# Altium footprint library Selex_PCBLib.PcbLib: 388 footprints (part 17 of 25)
Each footprint in its own frame and in the unit in brackets; x right, y up, seen from the top. Pads: shape width x height; smd on the part's side, far side on the other; paste and mask are expansions set on the pad; w line width, h text height; cw(c..) or ccw(c..) is an arc to the next point about the centre after c.
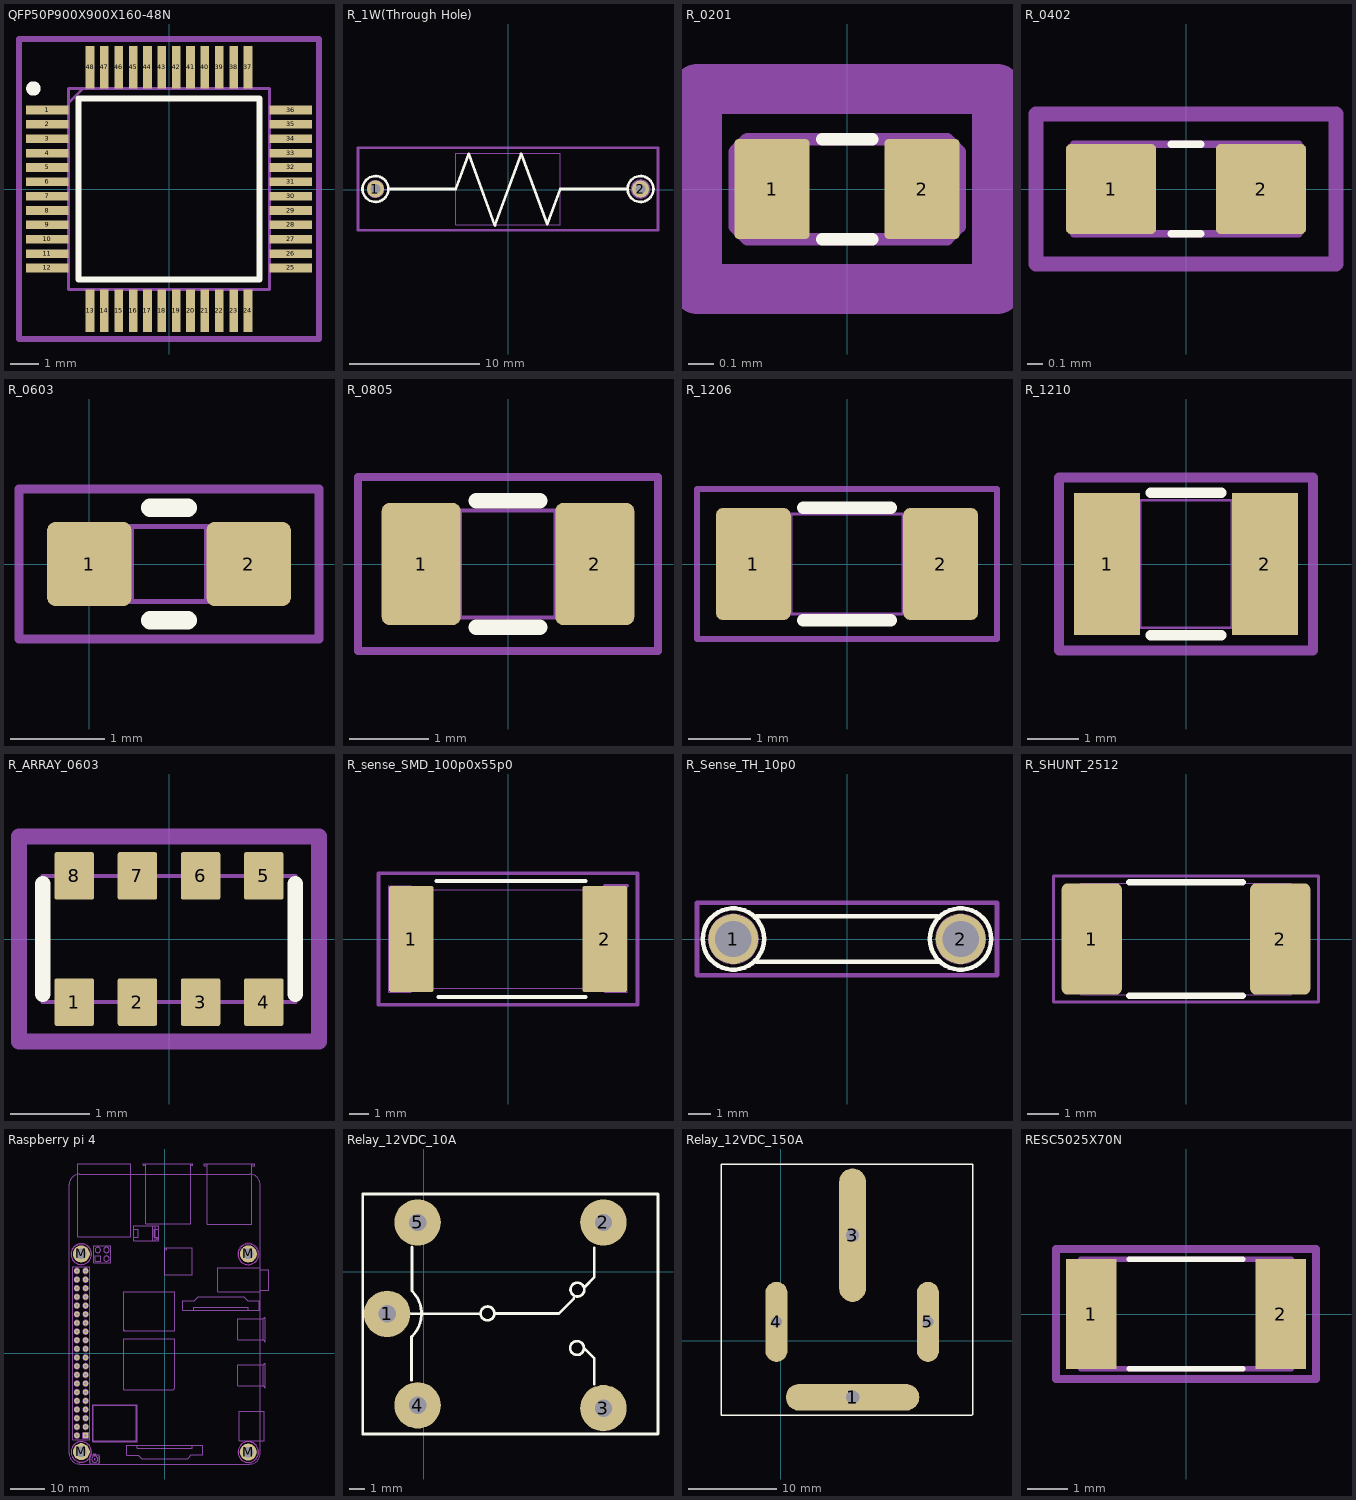
[diagram p16: the footprints below, top view; thin cyan lines are the x and y axes]

## QFP50P900X900X160-48N [mm]
pads (48):
  rect 1.475x0.3 smd: 1(-4.238,2.75) 2(-4.238,2.25) 3(-4.238,1.75) 4(-4.238,1.25) 5(-4.238,0.75) 6(-4.238,0.25) 7(-4.238,-0.25) 8(-4.238,-0.75) 9(-4.238,-1.25) 10(-4.238,-1.75) 11(-4.238,-2.25) 12(-4.238,-2.75) 25(4.238,-2.75) 26(4.238,-2.25) 27(4.238,-1.75) 28(4.238,-1.25) 29(4.238,-0.75) 30(4.238,-0.25) 31(4.238,0.25) 32(4.238,0.75) 33(4.238,1.25) 34(4.238,1.75) 35(4.238,2.25) 36(4.238,2.75)
  rect 0.3x1.475 smd: 13(-2.75,-4.238) 14(-2.25,-4.238) 15(-1.75,-4.238) 16(-1.25,-4.238) 17(-0.75,-4.238) 18(-0.25,-4.238) 19(0.25,-4.238) 20(0.75,-4.238) 21(1.25,-4.238) 22(1.75,-4.238) 23(2.25,-4.238) 24(2.75,-4.238) 37(2.75,4.238) 38(2.25,4.238) 39(1.75,4.238) 40(1.25,4.238) 41(0.75,4.238) 42(0.25,4.238) 43(-0.25,4.238) 44(-0.75,4.238) 45(-1.25,4.238) 46(-1.75,4.238) 47(-2.25,4.238) 48(-2.75,4.238)
Top Overlay:
  circle w0.25: c-4.725,3.5 r0.125
  lines w0.2: -3.15,-3.15 3.15,-3.15 3.15,3.15 -3.15,3.15 -3.15,-3.15
Mechanical 13:
  lines w0.1: -3.5,3 -3,3.5 ; -3.5,-3.5 3.5,-3.5 3.5,3.5 -3.5,3.5 -3.5,-3.5
Mechanical 15:
  lines w0.2: -5.225,-5.225 5.225,-5.225 5.225,5.225 -5.225,5.225 -5.225,-5.225
3D body "stm32f103c8t6.stp": height 1.6, standoff 0, extent -4.5,-4.5 4.5,4.5

## R_1W(Through Hole) [mm]
pads (2):
  round 1.3 hole 0.8 mask+0.1: 1(-10.16,0.05) 2(10.16,0.05)
Top Overlay:
  circle w0.2: c-10.16,0.05 r0.995
  circle w0.2: c10.16,0.05 r0.995
  lines w0.2: -9.165,0.05 -4,0.05 -3,2.75 -1,-2.75 1,2.75 3,-2.65 4,0.05 9.1,0.05
Mechanical 1:
  circle w0.2: c10.16,0.05 r0.65
  circle w0.05: c-10.16,0.05 r0.65
  lines w0.05: -9.51,0.05 -4,0.05 ; 4,0.05 9.5,0.05 ; -4,-2.7 -4,2.8 4,2.8 4,-2.7 -4,-2.7
  text "1W" at -1.3,-0.85 h1.6
Mechanical 15:
  lines w0.1: -11.5,-3.1 -11.5,-3.1
  lines w0.2: -11.5,-3.1 -11.5,3.2 11.5,3.2 11.5,-3.1 -11.5,-3.1
3D body "RES2Wa.step": height 6.25, standoff -9.25, extent -10.56,-2.8 10.56,2.7

## R_0201 [mm] "Resistor 0201"
pads (2):
  rrect10% 0.3x0.4 smd mask+0.01: 1(-0.3,0) 2(0.3,0)
Top Overlay:
  lines w0.05: -0.1,-0.2 0.1,-0.2 ; -0.1,0.2 0.1,0.2
Mechanical 1:
  lines w0.05: -0.3,-0.2 -0.3,0.2 ; 0.3,-0.2 0.3,0.2 ; -0.45,0.15 -0.4,0.2 ; -0.45,0.15 -0.4,0.2 ; -0.45,0.15 -0.45,-0.15 -0.4,-0.2 0,-0.2 0.4,-0.2 0.45,-0.15 0.45,0.15 0.4,0.2 0,0.2 -0.4,0.2
Mechanical 15:
  lines w0.2: -0.6,-0.4 0.6,-0.4 0.6,0.4 -0.6,0.4 -0.6,-0.4
3D body "User Library-RES_0603-0201.step": height 0.34, standoff 0, extent -0.34,-0.165 0.34,0.165

## R_0402 [mm] "Resistor 0402"
pads (2):
  rrect10% 0.6x0.6 smd mask+0.05: 1(-0.5,0) 2(0.5,0)
Top Overlay:
  lines w0.05: -0.1,-0.3 0.1,-0.3 ; -0.1,0.3 0.1,0.3
Mechanical 1:
  lines w0.05: -0.25,-0.3 -0.75,-0.3 -0.75,0.3 -0.25,0.3 ; 0.25,-0.3 0.75,-0.3 0.75,0.3 0.25,0.3 ; -0.5,-0.3 -0.5,0.3 0.5,0.3 0.5,-0.3 -0.5,-0.3
Mechanical 15:
  lines w0.1: -1,-0.5 -1,0.5 1,0.5 1,-0.5 -1,-0.5
3D body "User Library-RES_1005-0402.step": height 0.41, standoff 0, extent -0.575,-0.275 0.575,0.275

## R_0603 [mm] "Resistor 0603"
pads (2):
  rrect20% 0.9x0.9 smd mask+0.1: 1(0,0)
  rrect20% 0.9x0.9 smd: 2(1.7,0)
Top Overlay:
  lines w0.2: 0.65,-0.6 1.05,-0.6 ; 0.65,0.6 1.05,0.6
Top Component Outline:
  lines w0.1: -0.75,-0.8 -0.75,0.8 2.45,0.8 2.45,-0.8 -0.75,-0.8
Top Assembly:
  lines w0.05: 0.45,-0.4 0.45,0.4 ; 1.25,-0.4 1.25,0.4 ; 0.05,-0.4 0.05,0.4 1.65,0.4 1.65,-0.4 0.05,-0.4
3D body "RES0603.step": height 0.56, standoff 0, extent 0,-0.4 1.7,0.4

## R_0805 [mm] "Resistor 0805"
pads (2):
  rrect20% 1x1.55 smd mask+0.1: 1(-1.1,0)
  rrect20% 1x1.55 smd: 2(1.1,0)
Top Overlay:
  lines w0.2: -0.4,-0.8 0.4,-0.8 ; -0.4,0.8 0.4,0.8
Mechanical 1:
  lines w0.05: -0.61,-0.675 -0.61,0.675 ; 0.6,-0.66 0.6,0.675 ; -1.1,-0.675 -1.1,0.675 1.1,0.675 1.1,-0.675 -1.1,-0.675
Mechanical 15:
  lines w0.1: -1.9,-1.1 1.9,-1.1 1.9,1.1 -1.9,1.1 -1.9,-1.1
3D body "User Library-RES_2013-0805.step": height 0.76, standoff 0, extent -1.15,-0.695 1.15,0.655

## R_1206 [mm] "Resistor 1206"
pads (2):
  rrect20% 1.2x1.8 smd mask+0.1: 1(-1.5,0) 2(1.5,0)
Top Overlay:
  lines w0.2: -0.7,-0.9 0.7,-0.9 ; -0.7,0.9 0.7,0.9
Mechanical 1:
  lines w0.05: -0.9,-0.8 -0.9,0.8 ; 0.9,-0.8 0.9,0.8 ; -1.6,-0.8 1.6,-0.8 1.6,0.8 -1.6,0.8 -1.6,-0.8
Mechanical 15:
  lines w0.1: -2.4,-1.2 2.4,-1.2 2.4,1.2 -2.4,1.2 -2.4,-1.2
3D body "RES1206.step": height 0.85, standoff 0, extent -1.675,-0.865 1.675,0.865

## R_1210 [mm] "Resistor 1210"
pads (2):
  rect 1.3x2.8 smd mask+0.1: 1(-1.55,0) 2(1.55,0)
Top Overlay:
  lines w0.2: -0.7,-1.4 0.7,-1.4 ; -0.7,1.4 0.7,1.4
Mechanical 1:
  lines w0.05: -0.9,-1.25 -0.9,1.25 ; 0.9,-1.25 0.9,1.25 ; -1.6,-1.25 1.6,-1.25 1.6,1.25 -1.6,1.25 -1.6,-1.25
Mechanical 15:
  lines w0.2: -2.5,-1.7 2.5,-1.7 2.5,1.7 -2.5,1.7 -2.5,-1.7
3D body "RES1210.step": height 0.6, standoff 0, extent -1.6,-1.25 1.6,1.25

## R_ARRAY_0603 [mm]
pads (8):
  rrect10% 0.5x0.6 smd mask+0.05: 1(-1.2,-0.8) 2(-0.4,-0.8) 3(0.4,-0.8) 4(1.2,-0.8) 5(1.2,0.8) 6(0.4,0.8) 7(-0.4,0.8) 8(-1.2,0.8)
Top Overlay:
  lines w0.2: -1.6,-0.7 -1.6,0.7 ; 1.6,-0.7 1.6,0.7
Mechanical 1:
  lines w0.05: -1.6,-0.8 -1.6,0.8 1.6,0.8 1.6,-0.8 -1.6,-0.8
Mechanical 15:
  lines w0.2: -1.9,-1.3 -1.9,1.3 1.9,1.3 1.9,-1.3 -1.9,-1.3
3D body "User Library-R-0603-Array-4-1.step": height -0.49, standoff -1.01, extent -1.6,-0.8 1.6,0.8

## R_sense_SMD_100p0x55p0 [mm]
pads (2):
  rrect10% 2.3x5.5 smd mask+0.07: 1(-5,0) 2(5,0)
Top Overlay:
  lines w0.2: -3.7,3 4,3 ; -3.6,-3 4,-3
Mechanical 1:
  lines w0.05: 5,2.75 5,-2.75 6.15,-2.75 6.15,2.75 ; -6.15,-2.75 -6.15,2.75 -5,2.75 -5,-2.75 -6.15,-2.75 ; -5,-2.55 5,-2.55 5,2.55 -5,2.55 -5,-2.55
  lines w0.2: 5,2.75 6.15,2.75
Mechanical 15:
  lines w0.2: -6.7,-3.4 6.7,-3.4 6.7,3.4 -6.7,3.4 -6.7,-3.4
3D body "User Library-WSL3921.step": height 0.83, standoff 0, extent -5,-2.6 5,2.6

## R_Sense_TH_10p0 [mm]
pads (2):
  round 2.2 hole 1.6 mask+0.05: 1(-5,0) 2(5,0)
Top Overlay:
  circle w0.2: c5,0 r1.35
  circle w0.2: c-5,0 r1.35
  lines w0.2: -4,-1 4.1,-1 ; -4,1 4,1
Mechanical 1:
  circle w0.05: c5,0 r1.1
  circle w0.05: c-5,0 r1.1
Mechanical 15:
  lines w0.2: -6.6,-1.6 -6.6,1.6 6.6,1.6 6.6,-1.6 -6.6,-1.6

## R_SHUNT_2512 [mil]
pads (2):
  rrect20% 75x139 smd: 1(-117.5,0) 2(117.5,0)
Top Overlay:
  lines w7.87: -70.87,-70.87 70.87,-70.87 ; -70.87,70.87 70.87,70.87
Mechanical 1:
  lines w1: -131,-69.5 131,-69.5 ; -131,-69.5 -131,69.5 ; -131,-69.5 -131,69.5 ; -131,-69.5 -90,-69.5 -90,69.5 -131,69.5 ; -131,69.5 131,69.5 ; 131,-69.5 131,69.5 ; 131,-69.5 131,69.5 ; 131,-69.5 90,-69.5 90,69.5 131,69.5
Mechanical 15:
  lines w3.94: -165.35,-78.74 -165.35,78.74 165.35,78.74 165.35,-78.74 -165.35,-78.74
3D body "User Library-CSS2H-2512.STEP": height 32.6, standoff 0, extent -125,-60.04 125,60.04

## Raspberry pi 4 [mm]
pads (44):
  rect 1.6x1.6 hole 0.8: 1(-23.264,-24.189)
  round 1.6 hole 0.8: 2(-25.804,-24.189) 3(-23.264,-21.649) 4(-25.804,-21.649) 5(-23.264,-19.109) 6(-25.804,-19.109) 7(-23.264,-16.569) 8(-25.804,-16.569) 9(-23.264,-14.029) 10(-25.804,-14.029) 11(-23.264,-11.489) 12(-25.804,-11.489) 13(-23.264,-8.949) 14(-25.804,-8.949) 15(-23.264,-6.409) 16(-25.804,-6.409) 17(-23.264,-3.869) 18(-25.804,-3.869) 19(-23.264,-1.329) 20(-25.804,-1.329) 21(-23.264,1.211) 22(-25.804,1.211) 23(-23.264,3.751) 24(-25.804,3.751) 25(-23.264,6.291) 26(-25.804,6.291) 27(-23.264,8.831) 28(-25.804,8.831) 29(-23.264,11.371) 30(-25.804,11.371) 31(-23.264,13.911) 32(-25.804,13.911) 33(-23.264,16.451) 34(-25.804,16.451) 35(-23.264,18.991) 36(-25.804,18.991) 37(-23.264,21.531) 38(-25.804,21.531) 39(-23.264,24.071) 40(-25.804,24.071)
  round 5 hole 3.1: M(-24.5,-28.941) M(-24.5,29.059) M(24.466,-29.059) M(24.5,29.059)
Keep-Out Layer:
  circle w0.254: c-24.5,29.059 r3.045
  circle w0.254: c24.5,29.059 r3.137
  circle w0.254: c24.466,-29.059 r3.068
  circle w0.254: c-24.5,-28.941 r2.998
Mechanical 1:
  circle w0.013: c24.466,28.941 r3
  circle w0.013: c24.466,28.941 r1.35
  circle w0.013: c-24.534,28.941 r3
  circle w0.013: c-24.534,28.941 r1.35
  circle w0.013: c24.466,-29.059 r3
  circle w0.013: c24.466,-29.059 r1.35
  circle w0.013: c-24.534,-29.059 r3
  circle w0.013: c-24.534,-29.059 r1.35
Top Courtyard:
  lines w0.013: -28.034,-29.559 ccw(c-25.034,-29.559) -25.034,-32.559 24.966,-32.559 ccw(c24.966,-29.559) 27.966,-29.559 27.966,49.441 ccw(c24.966,49.441) 24.966,52.441 -25.034,52.441 ccw(c-25.034,49.441) -28.034,49.441 -28.034,-29.559
Mechanical 4:
  lines w0.013: -21.884,-32.059 -22.084,-32.059 -22.084,-30.259 -21.884,-30.259 ; -20.884,-29.859 -20.884,-29.559 -20.284,-29.559 -20.284,-29.859 ; -19.934,-25.959 -19.934,-25.759 ; -19.284,-32.059 -19.084,-32.059 -19.084,-30.259 -19.284,-30.259 ; -19.234,-25.959 -19.234,-25.759 ; -9.084,33.941 -7.784,33.941 -7.784,36.341 -9.084,36.341 ; -8.034,-27.109 -8.034,-28.009 7.966,-28.009 7.966,-27.109 ; -5.604,55.141 -6.284,55.141 -6.284,55.441 -5.604,55.441 ; -2.484,33.441 -2.084,33.441 ; -2.284,33.241 -2.284,33.291 -2.284,33.641 ; -1.784,33.941 -3.084,33.941 -3.084,36.341 -1.784,36.341 ; 7.536,55.141 8.216,55.141 8.216,55.441 7.536,55.441 ; 8.466,12.491 8.466,13.391 24.466,13.391 24.466,12.491 ; 12.396,54.941 11.616,54.941 11.616,55.441 12.396,55.441 ; 25.536,54.941 26.316,54.941 26.316,55.441 12.396,55.441 ; 25.536,55.441 25.536,37.741 12.396,37.741 12.396,55.441 ; -12.034,6.491 2.966,6.491 2.966,17.991 -12.034,17.991 -12.034,6.491 ; -12.034,6.491 -12.034,6.891 -11.634,6.491 -12.034,6.491 ; -5.604,55.441 -5.604,37.941 7.536,37.941 7.536,55.441 ; -5.604,55.441 7.536,55.441 ; 28.796,-9.659 29.296,-10.159 29.396,-10.159 29.396,-2.959 29.296,-2.959 28.796,-3.459 ; 28.796,-9.659 28.796,-3.459 ; 28.796,-9.659 21.446,-9.659 21.446,-3.459 28.796,-3.459 ; 28.796,3.841 29.296,3.341 29.396,3.341 29.396,10.541 29.296,10.541 28.796,10.041 ; 28.796,3.841 28.796,10.041 ; 28.796,3.841 21.446,3.841 21.446,10.041 28.796,10.041 ; -27.034,-25.459 -22.034,-25.459 -22.034,25.341 -27.034,25.341 -27.034,-25.459 ; -25.539,34.091 -10.029,34.091 -10.029,55.441 -25.539,55.441 -25.539,34.091 ; -21.884,-32.459 -19.284,-32.459 -19.284,-29.859 -21.884,-29.859 -21.884,-32.459 ; -21.134,-25.959 -8.134,-25.959 -8.134,-15.159 -21.134,-15.159 -21.134,-25.959 ; -20.934,-25.759 -8.334,-25.759 -8.334,-15.359 -20.934,-15.359 -20.934,-25.759 ; -20.894,26.441 -15.894,26.441 -15.894,31.441 -20.894,31.441 -20.894,26.441 ; -20.584,-32.081 ccw(c-20.584,-31.159) -20.584,-30.237 ccw(c-20.584,-31.159) -20.584,-32.081 ; -20.584,-31.359 ccw(c-20.584,-31.159) -20.584,-30.959 ccw(c-20.584,-31.159) -20.584,-31.359 ; -12.034,-10.809 2.46,-10.809 2.966,-10.303 2.966,4.191 -12.034,4.191 -12.034,-10.809 ; -11.234,-29.959 -7.834,-29.959 -6.734,-31.059 6.666,-31.059 7.816,-29.909 11.166,-29.909 11.166,-27.109 -11.234,-27.109 -11.234,-29.959 ; -9.084,32.991 -1.784,32.991 -1.784,37.291 -9.084,37.291 -9.084,32.991 ; -3.484,32.991 -2.784,32.991 -2.784,37.291 -3.484,37.291 -3.484,32.991 ; -0.034,22.941 7.966,22.941 7.966,30.941 -0.034,30.941 -0.034,22.941 ; 0.466,30.3 ccw(c0.466,30.441) 0.466,30.582 ccw(c0.466,30.441) 0.466,30.3 ; 5.266,12.491 27.666,12.491 27.666,15.341 24.266,15.341 23.166,16.441 9.766,16.441 8.616,15.291 5.266,15.291 5.266,12.491 ; 15.466,17.941 27.966,17.941 27.966,24.941 15.466,24.941 15.466,17.941 ; 21.816,-25.684 29.216,-25.684 29.216,-17.034 21.816,-17.034 21.816,-25.684 ; 27.966,18.441 30.466,18.441 30.466,24.441 27.966,24.441 27.966,18.441
Mechanical 5:
  circle w0.013: c-17.124,27.671 r0.8
  circle w0.013: c-17.124,30.211 r0.8
  circle w0.013: c-25.804,8.831 r0.8
  circle w0.013: c-23.264,8.831 r0.8
  circle w0.013: c-23.264,24.071 r0.8
  circle w0.013: c-23.264,21.531 r0.8
  circle w0.013: c-23.264,18.991 r0.8
  circle w0.013: c-23.264,16.451 r0.8
  circle w0.013: c-23.264,13.911 r0.8
  circle w0.013: c-23.264,11.371 r0.8
  circle w0.013: c-23.264,6.291 r0.8
  circle w0.013: c-23.264,3.751 r0.8
  circle w0.013: c-23.264,1.211 r0.8
  circle w0.013: c-23.264,-1.329 r0.8
  circle w0.013: c-23.264,-3.869 r0.8
  circle w0.013: c-23.264,-6.409 r0.8
  circle w0.013: c-23.264,-8.949 r0.8
  circle w0.013: c-23.264,-11.489 r0.8
  circle w0.013: c-23.264,-14.029 r0.8
  circle w0.013: c-23.264,-16.569 r0.8
  circle w0.013: c-23.264,-19.109 r0.8
  circle w0.013: c-23.264,-21.649 r0.8
  circle w0.013: c-25.804,24.071 r0.8
  circle w0.013: c-25.804,21.531 r0.8
  circle w0.013: c-25.804,18.991 r0.8
  circle w0.013: c-25.804,16.451 r0.8
  circle w0.013: c-25.804,13.911 r0.8
  circle w0.013: c-25.804,11.371 r0.8
  circle w0.013: c-25.804,6.291 r0.8
  circle w0.013: c-25.804,3.751 r0.8
  circle w0.013: c-25.804,1.211 r0.8
  circle w0.013: c-25.804,-1.329 r0.8
  circle w0.013: c-25.804,-3.869 r0.8
  circle w0.013: c-25.804,-6.409 r0.8
  circle w0.013: c-25.804,-8.949 r0.8
  circle w0.013: c-25.804,-11.489 r0.8
  circle w0.013: c-25.804,-14.029 r0.8
  circle w0.013: c-25.804,-16.569 r0.8
  circle w0.013: c-25.804,-19.109 r0.8
  circle w0.013: c-25.804,-21.649 r0.8
  circle w0.013: c-25.804,-24.189 r0.8
  circle w0.013: c-19.664,30.211 r0.8
  lines w0.013: -24.064,-24.989 -24.064,-23.389 -22.464,-23.389 -22.464,-24.989 -24.064,-24.989 ; -20.464,26.871 -20.464,28.471 -18.864,28.471 -18.864,26.871 -20.464,26.871
3D body "SSW-120-01-G-D.stp": height 8.51, standoff -2.64, extent -27.027,-25.654 -22.073,25.654
3D body "Raspberry Pi 4 Model B.STEP": height 3, standoff -16.9, extent -28,-32.5 30.4,56.49
3D body "9774120360R (rev1).stp": height 0.9, standoff -12.5, extent -27.534,25.941 -21.534,31.941
3D body "9774120360R (rev1).stp": height 0.9, standoff -12.5, extent -27.568,-32.177 -21.568,-26.177
3D body "9774120360R (rev1).stp": height 0.9, standoff -12.5, extent 21.432,-32.177 27.432,-26.177
3D body "9774120360R (rev1).stp": height 0.9, standoff -12.5, extent 21.466,25.941 27.466,31.941

## Relay_12VDC_10A [mil]
pads (5):
  round 120 hole 45: 1(-94.51,-109.44) 2(464.55,126.78) 3(464.55,-353.22) 4(-15.77,-345.66) 5(-15.77,126.78)
Top Overlay:
  circle w7: c164.91,-108.32 r17.8
  circle w7: c396.28,-197.62 r17.8
  circle w7: c397.28,-46.62 r17.8
  lines w7: -59.54,-109.32 144.71,-109.32 ; -31.29,-281.32 -31.29,-168.32 ; -30.29,-167.32 ccw(c-87.79,-108.82) -29.29,-51.32 ; -30.29,-50.32 -30.29,63.68 ; 184.71,-108.32 349.09,-108.32 ; 349.09,-108.42 388.09,-69.42 ; 414.09,-197.62 441.09,-224.62 441.09,-290.62 ; 415.09,-40.62 441.09,-14.62 441.09,61.38 ; -157.91,-420.04 -157.91,200.56 605.49,200.56 605.49,-420.04 -157.91,-420.04
  lines w10: 459.1,123.06 463.4,127.36
3D body "User Library-SONGLE Relay SRU-12VDC-SL-C.STEP": height 602.36, standoff -196.85, extent -149.61,-415.35 602.36,194.88

## Relay_12VDC_150A [mm]
pads (4):
  oval 15.011x3.023 hole 1.524 square: 1(8.1,-6.35)
  oval 3x15.011 hole 1.5 square: 3(8.1,11.887)
  oval 2.5x9 hole 1.2 square: 4(-0.46,2.134) 5(16.584,2.134)
Top Overlay:
  lines w0.167: 21.593,-8.357 8.1,-8.357 -6.643,-8.357 -6.657,-8.343 -6.657,2.134 -6.657,19.888 21.612,19.888 21.613,19.887 21.613,2.134 21.613,-8.337

## RESC5025X70N [mm]
pads (2):
  rect 1.24x2.72 smd: 1(-2.34,0) 2(2.34,0)
Top Overlay:
  lines w0.127: -1.4,-1.35 1.4,-1.35 ; -1.4,1.35 1.4,1.35
Mechanical 13:
  lines w0.127: -2.6,-1.35 2.6,-1.35 2.6,1.35 -2.6,1.35 -2.6,-1.35
Mechanical 15:
  lines w0.2: -3.208,-1.608 3.208,-1.608 3.208,1.608 -3.208,1.608 -3.208,-1.608
3D body "ERJ-12ZYJ470U.STEP": height 0.7, standoff 0, extent -2.5,-1.25 2.5,1.25